# Altium footprint library CeleronLib_THD.PcbLib: 217 footprints (part 10 of 14)
Each footprint in its own frame and in the unit in brackets; x right, y up, seen from the top. Pads: shape width x height; smd on the part's side, far side on the other; paste and mask are expansions set on the pad; w line width, h text height; cw(c..) or ccw(c..) is an arc to the next point about the centre after c.
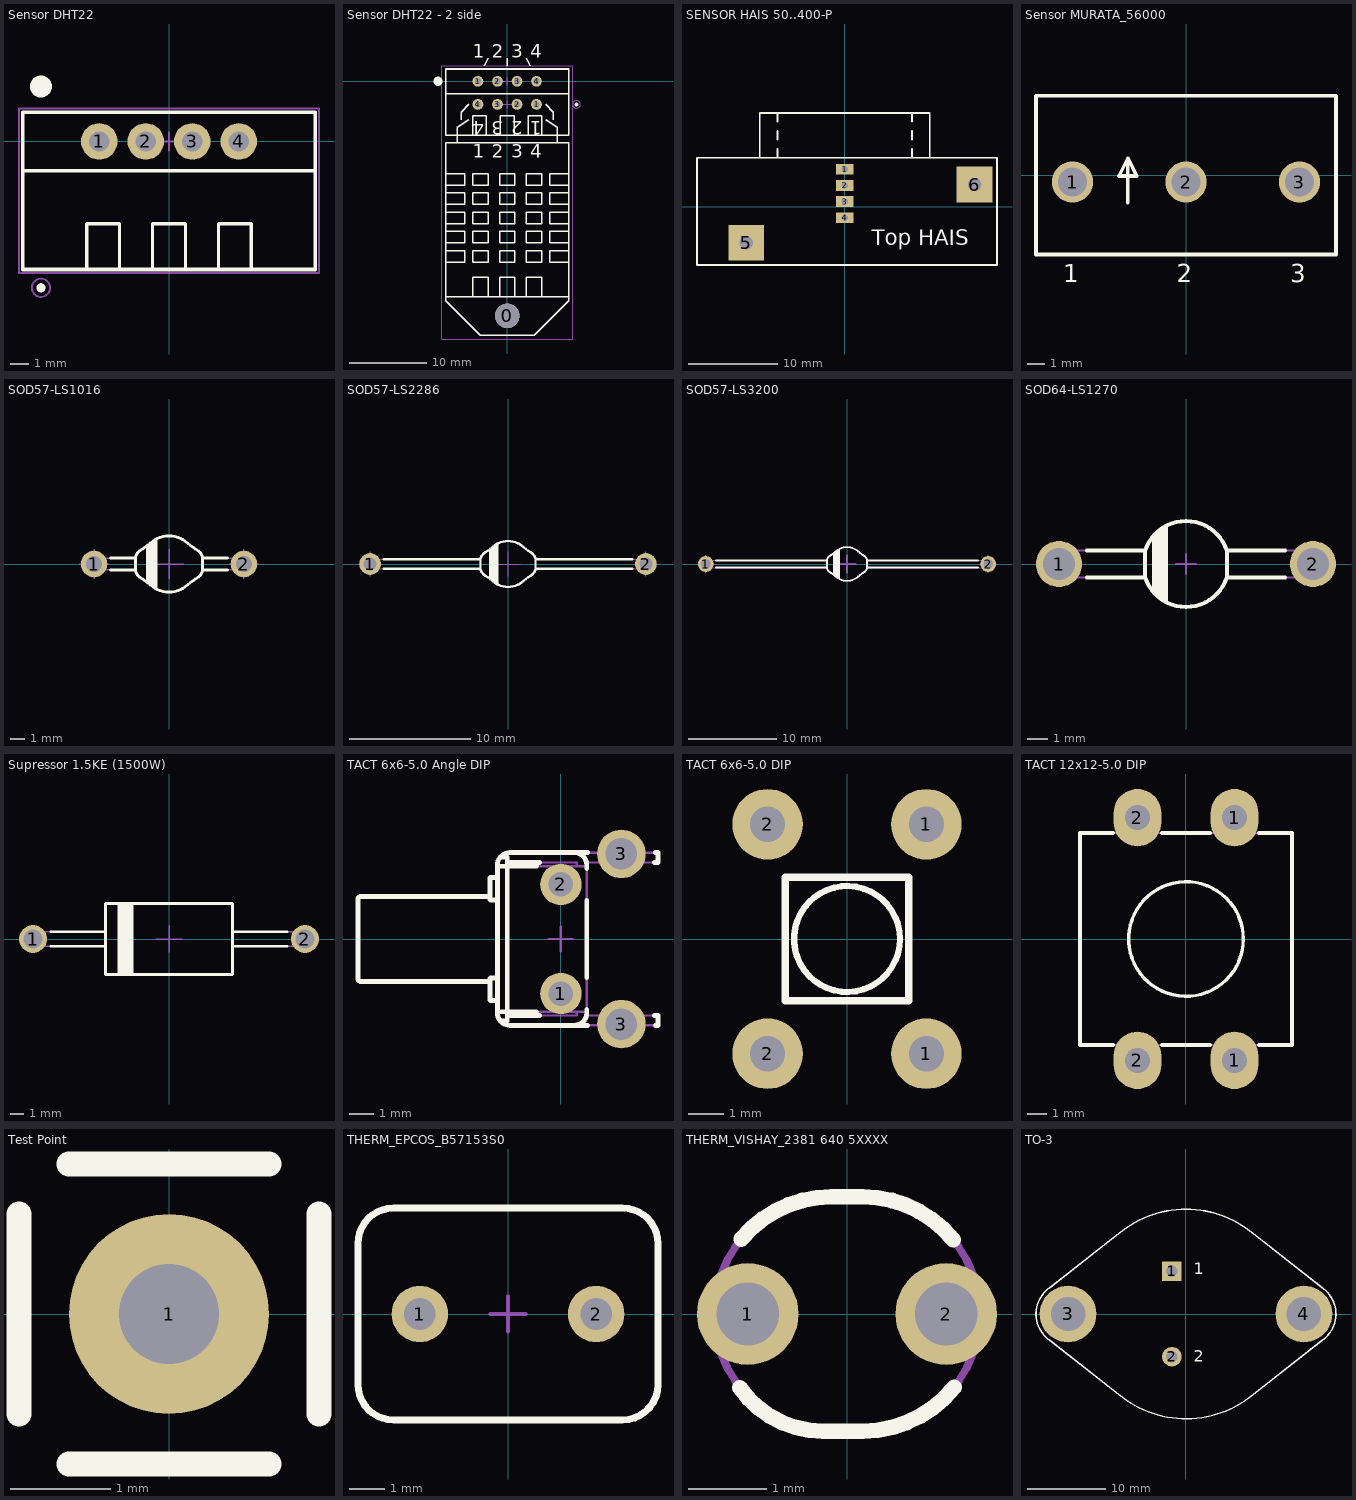
[diagram p9: the footprints below, top view; thin cyan lines are the x and y axes]

## Sensor DHT22 [mm] "4-Pin 2.54 mm Pitch (Датчики температуры и влажности)"
height 25
pads (4):
  round 2 hole 1.1: 1(-3.81,0) 2(-1.27,0) 3(1.27,0) 4(3.81,0)
Top Overlay:
  circle w0.25: c-7,-8 r0.125
  circle w0.6: c-7,3 r0.3
  lines w0.178: -8,-1.6 8,-1.6 ; -4.5,-7 -4.5,-4.5 -2.7,-4.5 -2.7,-7 ; -0.9,-7 -0.9,-4.5 0.9,-4.5 0.9,-7 ; 2.7,-7 2.7,-4.5 4.5,-4.5 4.5,-7
  lines w0.2: -8,-7 -8,1.6 8,1.6 8,-7 -8,-7
Top Assy:
  circle w0.1: c-7,-8 r0.5
  lines w0.1: -8,-7 -8,1.6 8,1.6 8,-7 -8,-7
Top Courtyard:
  lines w0.1: -0.5,0 0.5,0 ; 0,-0.5 0,0.5 ; -8.2,-7.2 -8.2,1.8 8.2,1.8 8.2,-7.2 -8.2,-7.2
3D body: height 20, standoff 0, extent -8,-7 8,1.6
3D body: height 25, standoff 0, extent -8,0 8,1.6

## Sensor DHT22 - 2 side [mm] "4-Pin 2.54 mm Pitch (Датчики температуры и влажности)"
height 25
pads (9):
  round 3.2 hole 3.2 unplated: 0(0,-30.5)
  round 1.4 hole 0.8: 1(-3.81,0) 1(3.81,-3) 2(-1.27,0) 2(1.27,-3) 3(-1.27,-3) 3(1.27,0) 4(-3.81,-3) 4(3.81,0)
Top Overlay:
  circle w0.25: c9,-3 r0.125
  circle w0.6: c-9,0 r0.3
  lines w0.178: -8,-28 8,-28 ; -8,-23.5 -5.5,-23.5 -5.5,-22 -8,-22 ; -8,-21 -5.5,-21 -5.5,-19.5 -8,-19.5 ; -8,-18.5 -5.5,-18.5 -5.5,-17 -8,-17 ; -8,-16 -5.5,-16 -5.5,-14.5 -8,-14.5 ; -8,-13.5 -5.5,-13.5 -5.5,-12 -8,-12 ; -8,-1.6 8,-1.6 ; -6.5,-8 -6.5,-6 -5,-5 ; -6,-5 -6,-4 -5,-3 ; -4.5,-28 -4.5,-25.5 -2.5,-25.5 -2.5,-28 ; -4.5,-7 -4.5,-4.5 -2.7,-4.5 -2.7,-7 ; -3,2 -2.5,3 ; -1,-28 -1,-25.5 1,-25.5 1,-28 ; -0.9,-7 -0.9,-4.5 0.9,-4.5 0.9,-7 ; 0,2 0,3 ; 2.5,-28 2.5,-25.5 4.5,-25.5 4.5,-28 ; 2.5,3 3,2 ; 2.7,-7 2.7,-4.5 4.5,-4.5 4.5,-7 ; 5,-5 6.5,-6 6.5,-8 ; 5,-3 6,-4 6,-5 ; 8,-23.5 5.5,-23.5 5.5,-22 8,-22 ; 8,-21 5.5,-21 5.5,-19.5 8,-19.5 ; 8,-18.5 5.5,-18.5 5.5,-17 8,-17 ; 8,-16 5.5,-16 5.5,-14.5 8,-14.5 ; 8,-13.5 5.5,-13.5 5.5,-12 8,-12 ; -8,-28.5 -8,-8 8,-8 8,-28.5 3.5,-33 -3.5,-33 -8,-28.5 ; -4.5,-23.5 -2.5,-23.5 -2.5,-22 -4.5,-22 -4.5,-23.5 ; -4.5,-21 -4.5,-19.5 -2.5,-19.5 -2.5,-21 -4.5,-21 ; -4.5,-18.5 -4.5,-17 -2.5,-17 -2.5,-18.5 -4.5,-18.5 ; -4.5,-16 -4.5,-14.5 -2.5,-14.5 -2.5,-16 -4.5,-16 ; -4.5,-13.5 -4.5,-12 -2.5,-12 -2.5,-13.5 -4.5,-13.5 ; -1,-23.5 -1,-22 1,-22 1,-23.5 -1,-23.5 ; -1,-21 1,-21 1,-19.5 -1,-19.5 -1,-21 ; -1,-18.5 1,-18.5 1,-17 -1,-17 -1,-18.5 ; -1,-16 1,-16 1,-14.5 -1,-14.5 -1,-16 ; -1,-13.5 1,-13.5 1,-12 -1,-12 -1,-13.5 ; 2.5,-23.5 2.5,-22 4.5,-22 4.5,-23.5 2.5,-23.5 ; 2.5,-21 4.5,-21 4.5,-19.5 2.5,-19.5 2.5,-21 ; 2.5,-18.5 4.5,-18.5 4.5,-17 2.5,-17 2.5,-18.5 ; 2.5,-16 4.5,-16 4.5,-14.5 2.5,-14.5 2.5,-16 ; 2.5,-13.5 4.5,-13.5 4.5,-12 2.5,-12 2.5,-13.5
  lines w0.2: -8,-7 -8,1.6 8,1.6 8,-7 -8,-7
  text "1" at 4.5,-4.6 h3
  text "2" at 2,-4.6 h3
  text "3" at -0.5,-4.6 h3
  text "4" at -3,-4.6 h3
  text "1" at -4.5,-10.5 h3
  text "2" at -2,-10.5 h3
  text "3" at 0.5,-10.5 h3
  text "4" at 3,-10.5 h3
  text "4" at 3,2.5 h3
  text "3" at 0.5,2.5 h3
  text "2" at -2,2.5 h3
  text "1" at -4.5,2.5 h3
Top Assy:
  circle w0.1: c9,-3 r0.5
  lines w0.1: -8,-7 -8,1.6 8,1.6 8,-7 -8,-7
Top Courtyard:
  lines w0.1: -0.5,-3 0.5,-3 ; -0.5,0 0.5,0 ; 0,-3.5 0,-2.5 ; 0,-0.5 0,0.5 ; -8.5,-33.5 -8.5,2 8.5,2 8.5,-33.5 -8.5,-33.5
3D body: height 20, standoff 0, extent -8,-7 8,1.6
3D body: height 25, standoff 0, extent -8,0 8,1.6
3D body: height 7, standoff 0, extent -8,-28 8,-8
3D body: height 1.7, standoff 0, extent -8,-33 8,-28

## SENSOR HAIS 50..400-P [mm] "Датчик тока фирмы LEM"
height 30
pads (6):
  rect 2x1.2 hole 0.7: 1(0,4.2) 2(0,2.4) 3(0,0.6) 4(0,-1.2)
  rect 4x4 hole 1.5: 5(-11,-4) 6(14.5,2.5)
Top Overlay:
  lines w0.2: -9.5,5.5 -9.5,10.5 9.5,10.5 9.5,5.5 ; -7.5,5.5 -7.5,6.5 ; -7.5,7.5 -7.5,8.5 ; -7.5,9.5 -7.5,10.5 ; 7.5,5.5 7.5,6.5 ; 7.5,7.5 7.5,8.5 ; 7.5,9.5 7.5,10.5 ; -16.5,-6.5 -16.5,5.5 17,5.5 17,-6.5 -16.5,-6.5
  text "Top HAIS" at 3,-4.9 h3

## Sensor MURATA_56000 [mm] "MURATA Current Sensing Transformer, Body 16.79x8.89mm, 5600 Serie"
height 20.19
pads (3):
  round 2.3 hole 1.6: 1(-6.35,-0.386) 2(0,-0.386) 3(6.35,-0.386)
Top Overlay:
  lines w0.2: -3.25,-1.55 -3.25,0.95 ; -3.25,0.95 -2.75,-0.05 -3.75,-0.05 -3.25,0.95 ; -8.395,-4.445 8.395,-4.445 8.395,4.445 -8.395,4.445 -8.395,-4.445
  text "3" at 5.835,-6 h1
  text "2" at -0.515,-6 h1
  text "1" at -6.865,-6 h1
Mechanical 8:
  lines w0.1: -6.85,-0.386 -6.35,-0.386 ; -6.35,-0.886 -6.35,-0.386 ; -6.35,0.114 -6.35,-0.386 ; -5.85,-0.386 -6.35,-0.386 ; -0.5,-0.386 0,-0.386 ; -0.5,0 0,0 ; 0,-0.886 0,-0.386 ; 0,0.5 0,0 ; 0.5,-0.386 0,-0.386 ; 0.5,0 0,0 ; 5.85,-0.386 6.35,-0.386 ; 6.35,-0.886 6.35,-0.386 ; 6.35,0.114 6.35,-0.386 ; 6.85,-0.386 6.35,-0.386
Top Assy:
  lines w0.1: -3.25,-1.55 -3.25,0.95 ; -3.25,0.95 -3.75,-0.05 -2.75,-0.05 -3.25,0.95 ; -8.395,-4.445 8.395,-4.445 8.395,4.445 -8.395,4.445 -8.395,-4.445
  text "3" at 5.835,-6 h1
  text "2" at -0.515,-6 h1
  text "1" at -6.865,-6 h1
3D body: height 20.19, standoff -3.6, extent -8.395,-4.445 8.395,4.445

## SOD57-LS1016 [mm] "Diode, Axial, Body L 4.57 x D 3.81 mm , Pin spacing 10.16mm"
height 2
pads (2):
  round 1.8 hole 1.1: 1(-5.08,0) 2(5.08,0)
Top Overlay:
  lines w0.2: -3.95,-0.4 -2.28,-0.4 ; -3.95,0.4 -2.28,0.4 ; -1.474,-1.244 -1.474,1.244 ; -1.274,-1.41 -1.274,1.41 ; -1.074,-1.568 -1.074,1.568 ; -0.874,-1.689 -0.874,1.689 ; 3.95,-0.4 2.28,-0.4 ; 3.95,0.4 2.28,0.4 ; -2.28,-0.4 ccw(c-1.512,-0.28) -1.883,-0.962 cw(c-2.839,-2.719) -1.681,-1.089 cw(c-4.575,-5.166) -1.26,-1.423 ccw(c0,0) -0.92,-1.663 -0.813,-1.723 ccw(c0,0) 0,-1.905 ccw(c0,0) 0.813,-1.723 0.92,-1.663 ccw(c0,0) 1.26,-1.423 cw(c4.575,-5.166) 1.681,-1.089 cw(c2.839,-2.719) 1.883,-0.962 ccw(c1.512,-0.28) 2.28,-0.4 ; -2.28,-0.4 -2.28,0 -2.28,0.4 ; -2.28,0.4 cw(c-1.512,0.28) -1.883,0.962 ccw(c-2.839,2.719) -1.681,1.089 ccw(c-4.575,5.166) -1.26,1.423 cw(c0,0) -0.92,1.663 -0.813,1.723 cw(c0,0) 0,1.905 cw(c0,0) 0.813,1.723 0.92,1.663 cw(c0,0) 1.26,1.423 ccw(c4.575,5.166) 1.681,1.089 ccw(c2.839,2.719) 1.883,0.962 cw(c1.512,0.28) 2.28,0.4 ; 2.28,-0.4 2.28,0 2.28,0.4
Mechanical 8:
  lines w0.1: -6.08,0 -5.08,0 ; -5.08,-1 -5.08,0 ; -5.08,1 -5.08,0 ; -4.08,0 -5.08,0 ; -1,0 0,0 ; 0,-1 0,0 ; 0,1 0,0 ; 1,0 0,0 ; 4.08,0 5.08,0 ; 5.08,-1 5.08,0 ; 5.08,1 5.08,0 ; 6.08,0 5.08,0
Top Assy:
  lines w0.1: -1.474,-1.244 -1.474,1.244 ; -1.274,-1.41 -1.274,1.41 ; -1.074,-1.568 -1.074,1.568 ; -0.874,-1.689 -0.874,1.689 ; -2.28,-0.4 ccw(c-1.512,-0.28) -1.883,-0.962 cw(c-2.839,-2.719) -1.681,-1.089 cw(c-4.575,-5.166) -1.26,-1.423 ccw(c0,0) -0.92,-1.663 -0.813,-1.723 ccw(c0,0) 0,-1.905 ccw(c0,0) 0.813,-1.723 0.92,-1.663 ccw(c0,0) 1.26,-1.423 cw(c4.575,-5.166) 1.681,-1.089 cw(c2.839,-2.719) 1.883,-0.962 ccw(c1.512,-0.28) 2.28,-0.4 ; -2.28,-0.4 -5.08,-0.4 cw(c-5.08,0) -5.08,0.4 -2.28,0.4 ; -2.28,-0.4 -2.28,0 -2.28,0.4 ; -2.28,0.4 cw(c-1.512,0.28) -1.883,0.962 ccw(c-2.839,2.719) -1.681,1.089 ccw(c-4.575,5.166) -1.26,1.423 cw(c0,0) -0.92,1.663 -0.813,1.723 cw(c0,0) 0,1.905 cw(c0,0) 0.813,1.723 0.92,1.663 cw(c0,0) 1.26,1.423 ccw(c4.575,5.166) 1.681,1.089 ccw(c2.839,2.719) 1.883,0.962 cw(c1.512,0.28) 2.28,0.4 ; 2.28,-0.4 5.08,-0.4 ccw(c5.08,0) 5.08,0.4 2.28,0.4 ; 2.28,-0.4 2.28,0 2.28,0.4
3D body: height 3.91, standoff -3, extent -5.475,-1.905 5.475,1.905

## SOD57-LS2286 [mm] "Diode, Axial, Body L 4.57 x D 3.81 mm , Pin spacing 22.86mm"
height 2
pads (2):
  round 1.8 hole 1.1: 1(-11.43,0) 2(11.43,0)
Top Overlay:
  lines w0.2: -10.3,-0.4 -2.28,-0.4 ; -10.3,0.4 -2.28,0.4 ; -1.474,-1.244 -1.474,1.244 ; -1.274,-1.41 -1.274,1.41 ; -1.074,-1.568 -1.074,1.568 ; -0.874,-1.689 -0.874,1.689 ; 10.3,-0.4 2.28,-0.4 ; 10.3,0.4 2.28,0.4 ; -2.28,-0.4 ccw(c-1.512,-0.28) -1.883,-0.962 cw(c-2.839,-2.719) -1.681,-1.089 cw(c-4.575,-5.166) -1.26,-1.423 ccw(c0,0) -0.92,-1.663 -0.813,-1.723 ccw(c0,0) 0,-1.905 ccw(c0,0) 0.813,-1.723 0.92,-1.663 ccw(c0,0) 1.26,-1.423 cw(c4.575,-5.166) 1.681,-1.089 cw(c2.839,-2.719) 1.883,-0.962 ccw(c1.512,-0.28) 2.28,-0.4 ; -2.28,-0.4 -2.28,0 -2.28,0.4 ; -2.28,0.4 cw(c-1.512,0.28) -1.883,0.962 ccw(c-2.839,2.719) -1.681,1.089 ccw(c-4.575,5.166) -1.26,1.423 cw(c0,0) -0.92,1.663 -0.813,1.723 cw(c0,0) 0,1.905 cw(c0,0) 0.813,1.723 0.92,1.663 cw(c0,0) 1.26,1.423 ccw(c4.575,5.166) 1.681,1.089 ccw(c2.839,2.719) 1.883,0.962 cw(c1.512,0.28) 2.28,0.4 ; 2.28,-0.4 2.28,0 2.28,0.4
Mechanical 8:
  lines w0.1: -12.43,0 -11.43,0 ; -11.43,-1 -11.43,0 ; -11.43,1 -11.43,0 ; -10.43,0 -11.43,0 ; -1,0 0,0 ; 0,-1 0,0 ; 0,1 0,0 ; 1,0 0,0 ; 10.43,0 11.43,0 ; 11.43,-1 11.43,0 ; 11.43,1 11.43,0 ; 12.43,0 11.43,0
Top Assy:
  lines w0.1: -1.474,-1.244 -1.474,1.244 ; -1.274,-1.41 -1.274,1.41 ; -1.074,-1.568 -1.074,1.568 ; -0.874,-1.689 -0.874,1.689 ; -2.28,-0.4 ccw(c-1.512,-0.28) -1.883,-0.962 cw(c-2.839,-2.719) -1.681,-1.089 cw(c-4.575,-5.166) -1.26,-1.423 ccw(c0,0) -0.92,-1.663 -0.813,-1.723 ccw(c0,0) 0,-1.905 ccw(c0,0) 0.813,-1.723 0.92,-1.663 ccw(c0,0) 1.26,-1.423 cw(c4.575,-5.166) 1.681,-1.089 cw(c2.839,-2.719) 1.883,-0.962 ccw(c1.512,-0.28) 2.28,-0.4 ; -2.28,-0.4 -2.28,0 -2.28,0.4 ; -2.28,-0.4 -11.43,-0.4 cw(c-11.43,0) -11.43,0.4 -2.28,0.4 ; -2.28,0.4 cw(c-1.512,0.28) -1.883,0.962 ccw(c-2.839,2.719) -1.681,1.089 ccw(c-4.575,5.166) -1.26,1.423 cw(c0,0) -0.92,1.663 -0.813,1.723 cw(c0,0) 0,1.905 cw(c0,0) 0.813,1.723 0.92,1.663 cw(c0,0) 1.26,1.423 ccw(c4.575,5.166) 1.681,1.089 ccw(c2.839,2.719) 1.883,0.962 cw(c1.512,0.28) 2.28,0.4 ; 2.28,-0.4 2.28,0 2.28,0.4 ; 2.28,-0.4 11.43,-0.4 ccw(c11.43,0) 11.43,0.4 2.28,0.4
3D body: height 3.91, standoff -3, extent -11.825,-1.905 11.825,1.905

## SOD57-LS3200 [mm] "Diode, Axial, Body L 4.57 x D 3.81 mm , Pin spacing 32mm"
height 2
pads (2):
  round 1.8 hole 1.1: 1(-16,0) 2(16,0)
Top Overlay:
  lines w0.2: -14.87,-0.4 -2.28,-0.4 ; -14.87,0.4 -2.28,0.4 ; -1.474,-1.244 -1.474,1.244 ; -1.274,-1.41 -1.274,1.41 ; -1.074,-1.568 -1.074,1.568 ; -0.874,-1.689 -0.874,1.689 ; 14.87,-0.4 2.28,-0.4 ; 14.87,0.4 2.28,0.4 ; -2.28,-0.4 ccw(c-1.512,-0.28) -1.883,-0.962 cw(c-2.839,-2.719) -1.681,-1.089 cw(c-4.575,-5.166) -1.26,-1.423 ccw(c0,0) -0.92,-1.663 -0.813,-1.723 ccw(c0,0) 0,-1.905 ccw(c0,0) 0.813,-1.723 0.92,-1.663 ccw(c0,0) 1.26,-1.423 cw(c4.575,-5.166) 1.681,-1.089 cw(c2.839,-2.719) 1.883,-0.962 ccw(c1.512,-0.28) 2.28,-0.4 ; -2.28,-0.4 -2.28,0 -2.28,0.4 ; -2.28,0.4 cw(c-1.512,0.28) -1.883,0.962 ccw(c-2.839,2.719) -1.681,1.089 ccw(c-4.575,5.166) -1.26,1.423 cw(c0,0) -0.92,1.663 -0.813,1.723 cw(c0,0) 0,1.905 cw(c0,0) 0.813,1.723 0.92,1.663 cw(c0,0) 1.26,1.423 ccw(c4.575,5.166) 1.681,1.089 ccw(c2.839,2.719) 1.883,0.962 cw(c1.512,0.28) 2.28,0.4 ; 2.28,-0.4 2.28,0 2.28,0.4
Mechanical 8:
  lines w0.1: -17,0 -16,0 ; -16,-1 -16,0 ; -16,1 -16,0 ; -15,0 -16,0 ; 15,0 16,0 ; 16,-1 16,0 ; 16,1 16,0 ; 17,0 16,0
  lines w0.2: -1,0 0,0 ; 0,-1 0,0 ; 0,1 0,0 ; 1,0 0,0
Top Assy:
  lines w0.1: -2.28,-0.4 -16,-0.4 cw(c-16,0) -16,0.4 -2.28,0.4 ; 2.28,-0.4 16,-0.4 ccw(c16,0) 16,0.4 2.28,0.4
  lines w0.2: -1.474,-1.244 -1.474,1.244 ; -1.274,-1.41 -1.274,1.41 ; -1.074,-1.568 -1.074,1.568 ; -0.874,-1.689 -0.874,1.689 ; -2.28,-0.4 ccw(c-1.512,-0.28) -1.883,-0.962 cw(c-2.839,-2.719) -1.681,-1.089 cw(c-4.575,-5.166) -1.26,-1.423 ccw(c0,0) -0.92,-1.663 -0.813,-1.723 ccw(c0,0) 0,-1.905 ccw(c0,0) 0.813,-1.723 0.92,-1.663 ccw(c0,0) 1.26,-1.423 cw(c4.575,-5.166) 1.681,-1.089 cw(c2.839,-2.719) 1.883,-0.962 ccw(c1.512,-0.28) 2.28,-0.4 2.28,0 2.28,0.4 ccw(c1.512,0.28) 1.883,0.962 cw(c2.839,2.719) 1.681,1.089 cw(c4.575,5.166) 1.26,1.423 ccw(c0,0) 0.92,1.663 0.813,1.723 ccw(c0,0) 0,1.905 ccw(c0,0) -0.813,1.723 -0.92,1.663 ccw(c0,0) -1.26,1.423 cw(c-4.575,5.166) -1.681,1.089 cw(c-2.839,2.719) -1.883,0.962 ccw(c-1.512,0.28) -2.28,0.4 -2.28,0 -2.28,-0.4
3D body: height 3.91, standoff -3, extent -16.395,-1.905 16.395,1.905

## SOD64-LS1270 [mm] "Diode, Axial, Body L 4 x D 4.3mm , Pin spacing 12.7mm"
height 4.85
pads (2):
  round 2.3 hole 1.6: 1(-6.35,0) 2(6.35,0)
Top Overlay:
  lines w0.2: -4.955,-0.675 -2.041,-0.675 ; -4.955,0.675 -2.041,0.675 ; -1.6,-1.436 -1.6,1.436 ; -1.4,-1.632 -1.4,1.632 ; -1.2,-1.784 -1.2,1.784 ; -1,-1.903 -1,1.903 ; 4.955,-0.675 2.041,-0.675 ; 4.955,0.675 2.041,0.675 ; -2.041,-0.675 ccw(c0,0) 2.041,-0.675 ; -2.041,-0.675 -2.041,0.675 ; -2.041,0.675 cw(c0,0) 2.041,0.675 ; 2.041,-0.675 2.041,0.675
Mechanical 8:
  lines w0.1: -6.85,0 -6.35,0 ; -6.35,-0.5 -6.35,0 ; -6.35,0.5 -6.35,0 ; -5.85,0 -6.35,0 ; -0.5,0 0,0 ; 0,-0.5 0,0 ; 0,0.5 0,0 ; 0.5,0 0,0 ; 5.85,0 6.35,0 ; 6.35,-0.5 6.35,0 ; 6.35,0.5 6.35,0 ; 6.85,0 6.35,0
Top Assy:
  lines w0.1: -1.6,-1.436 -1.6,1.436 ; -1.4,-1.632 -1.4,1.632 ; -1.2,-1.784 -1.2,1.784 ; -1,-1.903 -1,1.903 ; -2.041,-0.675 ccw(c0,0) 2.041,-0.675 ; -2.041,-0.675 -6.35,-0.675 cw(c-6.35,0) -6.35,0.675 -2.041,0.675 ; -2.041,-0.675 -2.041,0.675 ; -2.041,0.675 cw(c0,0) 2.041,0.675 ; 2.041,-0.675 2.041,0.675 ; 2.041,-0.675 6.35,-0.675 ccw(c6.35,0) 6.35,0.675 2.041,0.675
3D body: height 4.85, standoff -2.65, extent -7.025,-2.15 7.025,2.15

## Supressor 1.5KE (1500W) [mm] "VISHAY 1.5KE Case Style, Diode, Axial; Lead Spacing 20.32mm, Lead Dia. 1.07mm, Body Length 9.5mm, Body Dia. 5.3mm"
height 5.3
pads (2):
  round 2.1 hole 1.4: 1(-10.16,0) 2(10.16,0)
Top Overlay:
  lines w0.2: -8.812,-0.535 -4.75,-0.535 ; -8.812,0.535 -4.75,0.535 ; -3.75,-2.65 -3.75,2.65 ; -3.55,-2.65 -3.55,2.65 ; -3.35,-2.65 -3.35,2.65 ; -3.15,-2.65 -3.15,2.65 ; -2.95,-2.65 -2.95,2.65 ; -2.75,-2.65 -2.75,2.65 ; 4.75,-0.535 8.812,-0.535 ; 4.75,0.535 8.812,0.535 ; -4.75,-2.65 4.75,-2.65 4.75,2.65 -4.75,2.65 -4.75,-2.65
Mechanical 8:
  lines w0.1: -11.16,0 -10.16,0 ; -10.16,-1 -10.16,0 ; -10.16,1 -10.16,0 ; -9.16,0 -10.16,0 ; -1,0 0,0 ; 0,-1 0,0 ; 0,1 0,0 ; 1,0 0,0 ; 9.16,0 10.16,0 ; 10.16,-1 10.16,0 ; 10.16,1 10.16,0 ; 11.16,0 10.16,0
Top Assy:
  lines w0.1: -4.75,-0.535 -10.16,-0.535 cw(c-10.16,0) -10.16,0.535 -4.75,0.535 ; -3.75,-2.65 -3.75,2.65 ; -3.55,-2.65 -3.55,2.65 ; -3.35,-2.65 -3.35,2.65 ; -3.15,-2.65 -3.15,2.65 ; -2.95,-2.65 -2.95,2.65 ; -2.75,-2.65 -2.75,2.65 ; 4.75,-0.535 10.16,-0.535 ccw(c10.16,0) 10.16,0.535 4.75,0.535 ; -4.75,-2.65 4.75,-2.65 4.75,2.65 -4.75,2.65 -4.75,-2.65
3D body: height 5.3, standoff -3.8, extent -10.695,-2.65 10.695,2.65

## TACT 6x6-5.0 Angle DIP [mm] "Right Angle Micro Miniature Tactile Pushbutton Switche, Round Actuator Length = 5.74mm, FSMRAJ Serie"
height 7.01
pads (4):
  round 1.7 hole 1: 1(0,-2.25) 2(0,2.25)
  round 2 hole 1.3: 3(2.49,-3.505) 3(2.49,3.505)
Top Overlay:
  lines w0.2: -2.921,-1.753 -8.23,-1.753 cw(c-8.23,-1.626) -8.357,-1.626 -8.357,1.626 cw(c-8.23,1.626) -8.23,1.753 -2.921,1.753 ; -2.616,-2.997 -2.21,-2.997 -1.002,-2.997 ; -2.616,-2.54 -2.87,-2.54 cw(c-2.87,-2.489) -2.921,-2.489 -2.921,-1.651 cw(c-2.87,-1.651) -2.87,-1.6 -2.616,-1.6 ; -2.616,1.6 -2.87,1.6 cw(c-2.87,1.651) -2.921,1.651 -2.921,2.489 cw(c-2.87,2.489) -2.87,2.54 -2.616,2.54 ; -2.616,2.997 -2.21,2.997 -1.002,2.997 ; -2.494,-3.378 -2.21,-3.378 -2.21,3.378 -2.494,3.378 ; -2.21,-3.15 -0.868,-3.15 ; -2.21,3.15 -0.868,3.15 ; 0.559,-3.556 ccw(c0.559,-3.048) 1.067,-3.048 ; 0.559,3.556 cw(c0.559,3.048) 1.067,3.048 ; 1.067,-3.15 1.067,-2.901 ; 1.067,-1.599 1.067,1.599 ; 1.067,2.901 1.067,3.15 ; 1.091,-3.556 -2.108,-3.556 cw(c-2.108,-3.048) -2.616,-3.048 -2.616,3.048 cw(c-2.108,3.048) -2.108,3.556 1.091,3.556 ; 3.844,-3.15 4.001,-3.15 4.001,-3.556 3.889,-3.556 ; 3.844,3.15 4.001,3.15 4.001,3.556 3.889,3.556
Mechanical 8:
  lines w0.1: -0.5,-2.25 0,-2.25 ; -0.5,0 0,0 ; -0.5,2.25 0,2.25 ; 0,-2.75 0,-2.25 ; 0,-1.75 0,-2.25 ; 0,-0.5 0,0 ; 0,0.5 0,0 ; 0,1.75 0,2.25 ; 0,2.75 0,2.25 ; 0.5,-2.25 0,-2.25 ; 0.5,0 0,0 ; 0.5,2.25 0,2.25 ; 1.99,-3.505 2.49,-3.505 ; 1.99,3.505 2.49,3.505 ; 2.49,-4.005 2.49,-3.505 ; 2.49,-3.005 2.49,-3.505 ; 2.49,3.005 2.49,3.505 ; 2.49,4.005 2.49,3.505 ; 2.99,-3.505 2.49,-3.505 ; 2.99,3.505 2.49,3.505
Top Assy:
  lines w0.1: -2.921,-1.753 -8.23,-1.753 cw(c-8.23,-1.626) -8.357,-1.626 -8.357,1.626 cw(c-8.23,1.626) -8.23,1.753 -2.921,1.753 ; -2.616,-2.997 -2.21,-2.997 1.067,-2.997 1.067,3.15 4.001,3.15 4.001,3.556 -2.108,3.556 ccw(c-2.108,3.048) -2.616,3.048 -2.616,-3.048 ccw(c-2.108,-3.048) -2.108,-3.556 4.001,-3.556 4.001,-3.15 1.067,-3.15 ; -2.616,-2.54 -2.87,-2.54 cw(c-2.87,-2.489) -2.921,-2.489 -2.921,-1.651 cw(c-2.87,-1.651) -2.87,-1.6 -2.616,-1.6 ; -2.616,1.6 -2.87,1.6 cw(c-2.87,1.651) -2.921,1.651 -2.921,2.489 cw(c-2.87,2.489) -2.87,2.54 -2.616,2.54 ; -2.616,2.997 -2.21,2.997 1.067,2.997 ; -2.494,-3.378 -2.21,-3.378 -2.21,3.378 -2.494,3.378 ; -2.21,-3.15 0.66,-3.15 0.66,-2.997 ; -2.21,3.15 0.66,3.15 0.66,2.997 ; 0.559,-3.556 ccw(c0.559,-3.048) 1.067,-3.048 ; 0.559,3.556 cw(c0.559,3.048) 1.067,3.048 ; 1.994,-3.556 1.994,-4.204 2.985,-4.204 2.985,-3.556 ; 1.994,3.556 1.994,4.204 2.985,4.204 2.985,3.556 ; 2.654,-3.556 2.654,-3.15 ; 2.654,3.15 2.654,3.556
3D body: height 7.01, standoff -3.51, extent -8.356,-4.204 4.001,4.204

## TACT 6x6-5.0 DIP [mm] "Кнопка тактовая, DIP, 6.5х4.5, h=5.0 мм, 13.0 мм  (KAN0611)"
height 5
pads (4):
  round 2 hole 1: 1(2.25,-3.25) 1(2.25,3.25) 2(-2.25,-3.25) 2(-2.25,3.25)
Top Overlay:
  circle w0.178: c0,0 r1.5
  lines w0.2: -1.75,-1.75 -1.75,1.75 1.75,1.75 1.75,-1.75 -1.75,-1.75
3D body: height 4.95, standoff -3.54, extent -3,-3.984 3,3.984

## TACT 12x12-5.0 DIP [mm] "Кнопка тактовая, DIP, 12х12, h=5.0 мм"
height 5
pads (4):
  oval 2.5x3 hole 1.3: 1(2.54,-6.35) 1(2.54,6.35) 2(-2.54,-6.35) 2(-2.54,6.35)
Top Overlay:
  circle w0.178: c0,0 r3
  lines w0.2: -3.81,-5.54 -5.54,-5.54 -5.54,5.54 -3.81,5.54 ; -1.27,-5.54 1.27,-5.54 ; -1.27,5.54 1.27,5.54 ; 3.81,-5.54 5.54,-5.54 5.54,5.54 3.81,5.54
Top 3D:
  circle w0.1: c2.54,-6.35 r0.3
  circle w0.1: c-2.54,-6.35 r0.3
  circle w0.1: c2.54,6.35 r0.3
  circle w0.1: c-2.54,6.35 r0.3
  circle w0.1: c0,0 r3
  lines w0.1: -5.54,-5.54 -5.54,5.54 5.54,5.54 5.54,-5.54 -5.54,-5.54 ; -3.175,-6.985 -1.905,-6.985 -1.905,-5.54 -3.175,-5.54 -3.175,-6.985 ; -3.175,5.54 -1.905,5.54 -1.905,6.985 -3.175,6.985 -3.175,5.54 ; 1.905,-6.985 1.905,-5.54 3.175,-5.54 3.175,-6.985 1.905,-6.985 ; 1.905,5.54 1.905,6.985 3.175,6.985 3.175,5.54 1.905,5.54
Top Assy:
  circle w0.1: c0,0 r3
  lines w0.1: -5.54,-5.54 5.54,-5.54 5.54,5.54 -5.54,5.54 -5.54,-5.54 ; -3.175,-6.985 -3.175,-5.54 -1.905,-5.54 -1.905,-6.985 -3.175,-6.985 ; -3.175,5.54 -3.175,6.985 -1.905,6.985 -1.905,5.54 -3.175,5.54 ; 1.905,-6.985 3.175,-6.985 3.175,-5.54 1.905,-5.54 1.905,-6.985 ; 1.905,5.54 3.175,5.54 3.175,6.985 1.905,6.985 1.905,5.54
3D body: height 0, standoff -2, extent 2.235,6.045 2.845,6.655
3D body: height 0, standoff -2, extent 2.235,-6.655 2.845,-6.045
3D body: height 0, standoff -2, extent -2.845,6.045 -2.235,6.655
3D body: height 0, standoff -2, extent -2.845,-6.655 -2.235,-6.045
3D body: height 3.7, standoff 0, extent -5.539,-5.539 5.539,5.539
3D body: height 5, standoff 1, extent -3.009,-3.009 3.009,3.009
3D body: height 1.5, standoff 0, extent -3.174,-6.984 -1.906,-5.541
3D body: height 1.5, standoff 0, extent -3.174,5.541 -1.906,6.984
3D body: height 1.5, standoff 0, extent 1.906,5.541 3.174,6.984
3D body: height 1.5, standoff 0, extent 1.906,-6.984 3.174,-5.541

## Test Point [mm] "Тестовая точка. Подключаемся и мерием сигнал."
height 5
pads (1):
  round 2 hole 1: 1(0,0)
Top Overlay:
  lines w0.254: -1.5,-1 -1.5,1 ; -1,-1.5 -0.5,-1.5 1,-1.5 ; -1,1.5 1,1.5 ; 1.5,-1 1.5,1
3D body: height 5.94, standoff -2.94, extent -1.25,-1.25 1.29,1.29

## THERM_EPCOS_B57153S0 [mm] "NTC thermistors, Body  D 8.5mm x W 6mm x H 13mmxxx"
height 13
pads (2):
  round 1.6 hole 0.9: 1(-2.5,0) 2(2.5,0)
Top Overlay:
  lines w0.2: -4.25,-2 ccw(c-3.25,-2) -3.25,-3 3.25,-3 ccw(c3.25,-2) 4.25,-2 4.25,2 ccw(c3.25,2) 3.25,3 -3.25,3 ccw(c-3.25,2) -4.25,2 -4.25,-2
Mechanical 8:
  lines w0.1: -3,0 -2.5,0 ; -2.5,-0.5 -2.5,0 ; -2.5,0.5 -2.5,0 ; -2,0 -2.5,0 ; -0.5,0 0,0 ; 0,-0.5 0,0 ; 0,0.5 0,0 ; 0.5,0 0,0 ; 2,0 2.5,0 ; 2.5,-0.5 2.5,0 ; 2.5,0.5 2.5,0 ; 3,0 2.5,0
Top Assy:
  lines w0.1: -4.25,-2 ccw(c-3.25,-2) -3.25,-3 3.25,-3 ccw(c3.25,-2) 4.25,-2 4.25,2 ccw(c3.25,2) 3.25,3 -3.25,3 ccw(c-3.25,2) -4.25,2 -4.25,-2
3D body: height 13, standoff -3.8, extent -4.25,-3 4.25,3

## THERM_VISHAY_2381 640 5XXXX [mm] "RM_VISHAY_2381 640 5xxxx, Body 3.4x3mm"
height 9
pads (2):
  round 1.3 hole 0.8: 1(-1.27,0) 2(1.27,0)
Top Overlay:
  lines w0.2: -1.372,-0.942 ccw(c-0.308,-0.205) -0.308,-1.5 0.2,-1.5 ccw(c0.2,0) 1.371,-0.937 ; -1.352,0.96 cw(c-0.2,0) -0.2,1.5 0.2,1.5 cw(c0.2,0) 1.361,0.95
Top Assy:
  lines w0.1: 0.2,1.5 cw(c0.2,0) 0.2,-1.5 -0.2,-1.5 cw(c-0.2,0) -0.2,1.5 0.25,1.5
3D body: height 9, standoff -2.8, extent -1.7,-1.5 1.7,1.5

## TO-3 [mm] "Oval Flange Mount with (2) Offset Leads; Pin Spacing 10.92 mm; Lead Dia. 1.15 mm (max)"
height 8.92
pads (4):
  rect 2.5x2.5 hole 1.5: 1(-1.815,5.46)
  round 2.5 hole 1.5: 2(-1.815,-5.46)
  round 7.25 hole 4.4: 3(-15.075,0) 4(15.075,0)
Top Overlay:
  lines w0.2: -17.427,-3.359 -8.299,-10.521 ; -17.427,-3.358 cw(c-15.075,0) -17.427,3.359 -8.299,10.521 ; -8.613,-10.265 ccw(c0,0) 8.298,-10.521 17.427,-3.359 ; -8.613,10.265 cw(c0,0) 8.613,10.265 ; 8.299,10.521 17.427,3.359 ; 17.308,3.439 cw(c15.075,0) 17.427,-3.358
  text "1" at 1.016,5.08 h1.5
  text "2" at 1.016,-6.096 h1.5